# Altium footprint library con-molex.PCBLIB: 368 footprints (part 26 of 26)
Each footprint in its own frame and in the unit in brackets; x right, y up, seen from the top. Pads: shape width x height; smd on the part's side, far side on the other; paste and mask are expansions set on the pad; w line width, h text height; cw(c..) or ccw(c..) is an arc to the next point about the centre after c.
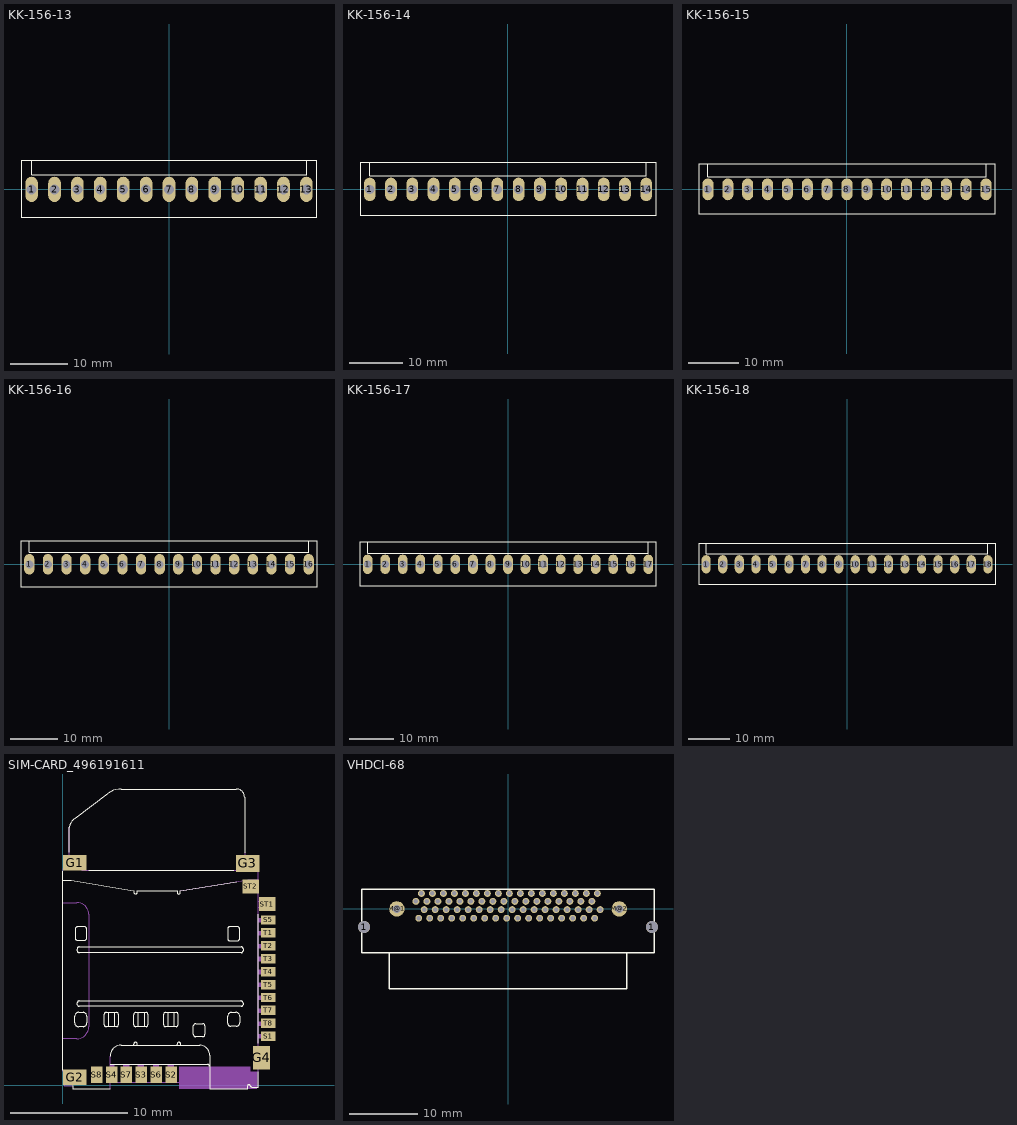
[diagram p25: the footprints below, top view; thin cyan lines are the x and y axes]

## KK-156-13 [mil]
pads (13):
  oval 86x172 hole 66.93: 1(-935.43,0) 2(-779.53,0) 3(-623.62,0) 4(-467.72,0) 5(-311.81,0) 6(-155.91,0) 7(0,0) 8(155.91,0) 9(311.81,0) 10(467.72,0) 11(623.62,0) 12(779.53,0) 13(935.43,0)
Top Overlay:
  lines w8: -935.63,194.88 936.61,194.88 ; -935.63,194.88 -1006.5,194.88 -1006.5,-189.96 1007.48,-189.96 1007.48,194.88 936.61,194.88 ; -935.63,194.88 -935.63,99.41 936.61,99.41 936.61,194.88

## KK-156-14 [mil]
pads (14):
  oval 86x172 hole 66.93: 1(-1013.39,0) 2(-857.48,0) 3(-701.57,0) 4(-545.67,0) 5(-389.76,0) 6(-233.86,0) 7(-77.95,0) 8(77.95,0) 9(233.86,0) 10(389.76,0) 11(545.67,0) 12(701.57,0) 13(857.48,0) 14(1013.39,0)
Top Overlay:
  lines w8: -1013.58,194.88 1014.57,194.88 ; -1013.58,194.88 -1084.45,194.88 -1084.45,-189.96 1085.43,-189.96 1085.43,194.88 1014.57,194.88 ; -1013.58,194.88 -1013.58,99.41 1014.57,99.41 1014.57,194.88

## KK-156-15 [mil]
pads (15):
  oval 86x172 hole 66.93: 1(-1091.34,0) 2(-935.43,0) 3(-779.53,0) 4(-623.62,0) 5(-467.72,0) 6(-311.81,0) 7(-155.91,0) 8(0,0) 9(155.91,0) 10(311.81,0) 11(467.72,0) 12(623.62,0) 13(779.53,0) 14(935.43,0) 15(1091.34,0)
Top Overlay:
  lines w8: -1091.54,194.88 1092.52,194.88 ; -1091.54,194.88 -1162.4,194.88 -1162.4,-189.96 1163.39,-189.96 1163.39,194.88 1092.52,194.88 ; -1091.54,194.88 -1091.54,99.41 1092.52,99.41 1092.52,194.88

## KK-156-16 [mil]
pads (16):
  oval 86x172 hole 66.93: 1(-1169.29,0) 2(-1013.39,0) 3(-857.48,0) 4(-701.57,0) 5(-545.67,0) 6(-389.76,0) 7(-233.86,0) 8(-77.95,0) 9(77.95,0) 10(233.86,0) 11(389.76,0) 12(545.67,0) 13(701.57,0) 14(857.48,0) 15(1013.39,0) 16(1169.29,0)
Top Overlay:
  lines w8: -1169.49,194.88 1170.47,194.88 ; -1169.49,194.88 -1240.35,194.88 -1240.35,-189.96 1241.34,-189.96 1241.34,194.88 1170.47,194.88 ; -1169.49,194.88 -1169.49,99.41 1170.47,99.41 1170.47,194.88

## KK-156-17 [mil]
pads (17):
  oval 86x172 hole 66.93: 1(-1247.24,0) 2(-1091.34,0) 3(-935.43,0) 4(-779.53,0) 5(-623.62,0) 6(-467.72,0) 7(-311.81,0) 8(-155.91,0) 9(0,0) 10(155.91,0) 11(311.81,0) 12(467.72,0) 13(623.62,0) 14(779.53,0) 15(935.43,0) 16(1091.34,0) 17(1247.24,0)
Top Overlay:
  lines w8: -1247.44,194.88 1248.43,194.88 ; -1247.44,194.88 -1318.31,194.88 -1318.31,-189.96 1319.29,-189.96 1319.29,194.88 1248.43,194.88 ; -1247.44,194.88 -1247.44,99.41 1248.43,99.41 1248.43,194.88

## KK-156-18 [mil]
pads (18):
  oval 86x172 hole 66.93: 1(-1325.2,0) 2(-1169.29,0) 3(-1013.39,0) 4(-857.48,0) 5(-701.57,0) 6(-545.67,0) 7(-389.76,0) 8(-233.86,0) 9(-77.95,0) 10(77.95,0) 11(233.86,0) 12(389.76,0) 13(545.67,0) 14(701.57,0) 15(857.48,0) 16(1013.39,0) 17(1169.29,0) 18(1325.2,0)
Top Overlay:
  lines w8: -1325.39,194.88 1326.38,194.88 ; -1325.39,194.88 -1396.26,194.88 -1396.26,-189.96 1397.24,-189.96 1397.24,194.88 1326.38,194.88 ; -1325.39,194.88 -1325.39,99.41 1326.38,99.41 1326.38,194.88

## SIM-CARD_496191611 [mm]
pads (22):
  rect 2x1.35 smd: G1(1,18.937) G2(1,0.675)
  rect 2x1.45 smd: G3(15.75,18.887)
  rect 1.45x2 smd: G4(16.925,2.35)
  rect 1.25x0.8 smd: S1(17.475,4.163) S5(17.475,14.062) T1(17.475,12.962) T2(17.475,11.863) T3(17.475,10.762) T4(17.475,9.662) T5(17.475,8.563) T6(17.475,7.463) T7(17.475,6.362) T8(17.475,5.263)
  rect 0.98x1.4 smd: S2(9.225,0.9) S3(6.685,0.9) S4(4.145,0.9) S6(7.955,0.9) S7(5.415,0.9) S8(2.875,0.9)
  rect 1.4x1.2 smd: ST1(17.4,15.412) ST2(16,16.913)
Top Overlay:
  lines w0.05: -0.032,1.27 -0.032,18.226 ; 0,17.464 0.73,17.464 6.033,16.543 6.033,16.448 ccw(c6.192,16.448) 6.351,16.448 6.351,16.543 9.717,16.543 9.717,16.416 ccw(c9.859,16.416) 10.002,16.416 10.002,16.543 14.797,17.337 ; 0.54,19.846 0.54,21.973 ; 0.857,-0.064 0.857,-0.318 4.033,-0.318 ; 2.223,18.29 14.543,18.29 ; 4.033,2.477 cw(c4.953,2.477) 4.954,3.398 11.653,3.398 cw(c11.653,2.54) 12.511,2.54 12.511,0.254 12.511,-0.318 15.718,-0.318 15.718,-0.095 15.718,-0.064 cw(c15.831,-0.064) 15.94,-0.032 ccw(c16.111,0.018) 16.131,-0.159 16.639,-0.159 16.639,1.143 ; 6.033,3.398 6.033,3.493 cw(c6.192,3.493) 6.192,3.652 cw(c6.192,3.493) 6.351,3.493 6.351,3.398 ; 9.717,3.398 9.717,3.493 cw(c9.875,3.493) 9.875,3.652 cw(c9.875,3.493) 10.034,3.493 10.034,3.398 ; 15.464,19.782 15.464,24.512 ccw(c14.764,24.512) 14.764,25.212 4.985,25.212 ccw(c4.967,23.326) 3.874,24.863 1.048,22.703 ccw(c1.64,21.749) 0.54,21.973 ; 16.639,3.556 16.639,14.543 ; 0.54,21.973 0.54,21.973 ; 1.048,12.543 ccw(c1.27,12.543) 1.27,12.32 1.81,12.32 ccw(c1.81,12.543) 2.032,12.543 2.032,13.273 ccw(c1.81,13.273) 1.81,13.495 1.27,13.495 ccw(c1.286,13.257) 1.048,13.241 1.048,12.543 ; 1.207,11.463 ccw(c1.397,11.463) 1.397,11.272 7.621,11.272 9.304,11.272 12.13,11.272 14.638,11.272 15.178,11.272 ccw(c15.178,11.431) 15.337,11.431 15.337,11.622 ccw(c15.178,11.622) 15.178,11.78 1.397,11.78 ccw(c1.397,11.59) 1.207,11.59 1.206,11.463 ; 14.035,12.479 14.035,12.511 14.035,13.305 cw(c14.225,13.305) 14.225,13.495 14.829,13.495 cw(c14.829,13.273) 15.051,13.273 15.051,12.511 cw(c14.829,12.511) 14.829,12.289 14.225,12.289 cw(c14.225,12.479) 14.035,12.479
  lines w0.1: 3.842,5.049 3.842,6.16 ; 4.033,1.778 12.32,1.778 cw(c12.32,1.62) 12.479,1.62 ; 4.382,5.017 4.382,6.16 ; 6.382,5.049 6.382,6.16 ; 6.922,5.049 6.922,6.16 ; 8.923,5.049 8.923,6.16 ; 9.431,5.017 9.431,6.16 ; 16.924,15.21 16.924,15.242 ; 1.016,5.303 ccw(c1.333,5.303) 1.333,4.985 1.715,4.985 ccw(c1.715,5.303) 2.032,5.303 2.032,5.874 ccw(c1.715,5.874) 1.715,6.192 1.333,6.192 ccw(c1.333,5.874) 1.016,5.874 1.016,5.303 ; 1.238,6.859 ccw(c1.397,6.859) 1.397,6.7 4.033,6.7 15.051,6.7 15.178,6.7 ccw(c15.178,6.859) 15.337,6.859 15.337,6.986 ccw(c15.146,6.986) 15.146,7.176 1.556,7.176 1.397,7.176 ccw(c1.397,7.017) 1.238,7.018 1.238,6.859 ; 3.525,5.144 ccw(c3.683,5.144) 3.683,4.985 4.573,4.985 ccw(c4.573,5.144) 4.731,5.144 4.731,6.033 ccw(c4.573,6.033) 4.573,6.192 3.683,6.192 ccw(c3.683,6.033) 3.525,6.033 3.525,5.144 ; 6.033,5.144 ccw(c6.192,5.144) 6.192,4.985 7.081,4.985 ccw(c7.081,5.144) 7.24,5.144 7.24,6.033 ccw(c7.081,6.033) 7.081,6.192 6.255,6.192 6.224,6.192 ccw(c6.224,6.001) 6.033,6.001 6.033,5.144 ; 8.573,5.144 ccw(c8.732,5.144) 8.732,4.985 9.653,4.985 ccw(c9.653,5.112) 9.78,5.112 9.78,6.097 ccw(c9.685,6.097) 9.685,6.192 8.732,6.192 ccw(c8.732,6.033) 8.573,6.033 8.573,5.144 ; 11.114,4.319 ccw(c11.304,4.319) 11.304,4.128 11.907,4.128 ccw(c11.907,4.319) 12.098,4.319 12.098,5.049 ccw(c11.907,5.049) 11.907,5.239 11.399,5.239 11.304,5.239 ccw(c11.304,5.049) 11.114,5.049 11.114,4.319 ; 14.035,5.271 ccw(c14.289,5.271) 14.289,5.017 14.765,5.017 ccw(c14.765,5.303) 15.051,5.303 15.051,5.874 ccw(c14.733,5.874) 14.733,6.192 14.352,6.192 ccw(c14.352,5.874) 14.035,5.874 14.035,5.271
Mechanical 16:
  rectangle: 16.639,13.844 17.687,14.225
  rectangle: 16.67,12.733 17.687,13.114
  rectangle: 16.67,11.622 17.687,12.034
  rectangle: 16.67,10.542 17.687,10.955
  rectangle: 16.67,9.431 17.687,9.844
  rectangle: 16.67,8.351 17.687,8.732
  rectangle: 16.67,7.272 17.687,7.653
  rectangle: 16.639,6.16 17.687,6.541
  rectangle: 16.67,5.049 17.687,5.43
  rectangle: 16.639,3.969 17.687,4.35
  rectangle: 4.001,0.667 4.382,1.747
  rectangle: 5.112,0.667 5.652,1.747
  rectangle: 6.351,0.667 6.922,1.715
  rectangle: 7.653,0.667 8.192,1.747
  rectangle: 8.891,0.699 9.463,1.747
  lines w0.05: -0.032,1.27 ccw(c0.162,1.27) 0.127,1.079 0.127,-0.064 0.857,-0.064 ; -0.032,18.226 cw(c0.286,18.226) 0.286,18.544 0.286,18.957 cw(c0.445,18.957) 0.445,19.115 0.667,19.115 cw(c0.667,18.957) 0.826,18.957 0.826,18.925 ccw(c0.921,18.925) 0.921,18.83 ccw(c0.921,18.925) 1.016,18.925 cw(c1.206,18.925) 1.206,19.115 1.429,19.115 cw(c1.429,18.957) 1.588,18.957 1.588,18.29 15.051,18.29 15.051,18.861 15.051,18.988 cw(c15.178,18.988) 15.178,19.115 15.432,19.115 cw(c15.432,18.988) 15.559,18.988 15.559,18.957 15.559,18.925 ccw(c15.686,18.925) 15.686,18.798 ccw(c15.686,18.925) 15.813,18.925 15.813,18.988 cw(c15.94,18.988) 15.94,19.115 16.194,19.115 cw(c16.194,18.957) 16.353,18.957 16.353,18.512 cw(c16.353,18.226) 16.639,18.226 16.639,18.195 16.639,1.683 16.639,-0.159 ; 0.54,19.147 0.54,21.973 ; 4.033,-0.318 4.033,0.254 ; 4.033,2.477 4.033,0.254 ; 10.002,16.543 15.75,17.496 16.607,17.496 ; 12.511,0.254 4.033,0.254 ; 15.464,19.147 15.464,19.781
  lines w0.1: 0,15.55 1.2,15.55 cw(c1.2,14.55) 2.2,14.55 2.2,4.962 cw(c1.187,4.962) 1.187,3.95 0.006,3.95 ; 16.67,1.747 16.988,1.747 ccw(c16.988,1.937) 17.178,1.937 17.178,2.064 ccw(c17.02,2.064) 17.02,2.223 16.988,2.223 cw(c16.988,2.35) 16.861,2.35 16.861,2.382 cw(c16.988,2.382) 16.988,2.509 17.051,2.509 ccw(c17.051,2.636) 17.178,2.636 17.178,2.731 ccw(c16.988,2.76) 16.988,2.953 16.67,2.953 ; 16.67,15.083 16.797,15.083 ccw(c16.797,15.21) 16.924,15.21 ; 16.67,15.654 16.734,15.654 16.797,15.654 cw(c16.797,15.527) 16.924,15.527 16.924,15.242
Mechanical 27:
  rectangle: 9.9,-0.325 15.988,1.6
  rectangle: 15.988,-0.325 16.537,1.175

## VHDCI-68 [mm]
pads (72):
  round 1.75 hole 1.75: 1(-20.95,-2.63) 1(20.95,-2.63)
  round 1 hole 0.65: 1(13.005,2.25) 2(12.205,1.1) 3(11.405,2.25) 4(10.605,1.1) 5(9.805,2.25) 6(9.005,1.1) 7(8.205,2.25) 8(7.405,1.1) 9(6.605,2.25) 10(5.805,1.1) 11(5.005,2.25) 12(4.205,1.1) 13(3.405,2.25) 14(2.605,1.1) 15(1.805,2.25) 16(1.005,1.1) 17(0.205,2.25) 18(-0.595,1.1) 19(-1.395,2.25) 20(-2.195,1.1) 21(-2.995,2.25) 22(-3.795,1.1) 23(-4.595,2.25) 24(-5.395,1.1) 25(-6.195,2.25) 26(-6.995,1.1) 27(-7.795,2.25) 28(-8.595,1.1) 29(-9.395,2.25) 30(-10.195,1.1) 31(-10.995,2.25) 32(-11.795,1.1) 33(-12.595,2.25) 34(-13.395,1.1) 35(13.405,-0.1) 36(12.605,-1.35) 37(11.805,-0.1) 38(11.005,-1.35) 39(10.205,-0.1) 40(9.405,-1.35) 41(8.605,-0.1) 42(7.805,-1.35) 43(7.005,-0.1) 44(6.205,-1.35) 45(5.405,-0.1) 46(4.605,-1.35) 47(3.805,-0.1) 48(3.005,-1.35) 49(2.205,-0.1) 50(1.405,-1.35) 51(0.605,-0.1) 52(-0.195,-1.35) 53(-0.995,-0.1) 54(-1.795,-1.35) 55(-2.595,-0.1) 56(-3.395,-1.35) 57(-4.195,-0.1) 58(-4.995,-1.35) 59(-5.795,-0.1) 60(-6.595,-1.35) 61(-7.395,-0.1) 62(-8.195,-1.35) 63(-8.995,-0.1) 64(-9.795,-1.35) 65(-10.595,-0.1) 66(-11.395,-1.35) 67(-12.195,-0.1) 68(-12.995,-1.35)
  round 2.25 hole 1.2: M@1(-16.175,0) M@2(16.175,0)
Top Overlay:
  lines w0.203: -17.25,-6.4 -17.25,-11.6 17.25,-11.6 17.25,-6.4 ; -17.25,-6.4 -21.25,-6.4 -21.25,2.85 21.263,2.85 21.263,-6.4 17.25,-6.4 ; -17.25,-6.4 17.25,-6.4